# Altium schematic symbol library relay.SCHLIB: 425 symbols (part 2 of 3)
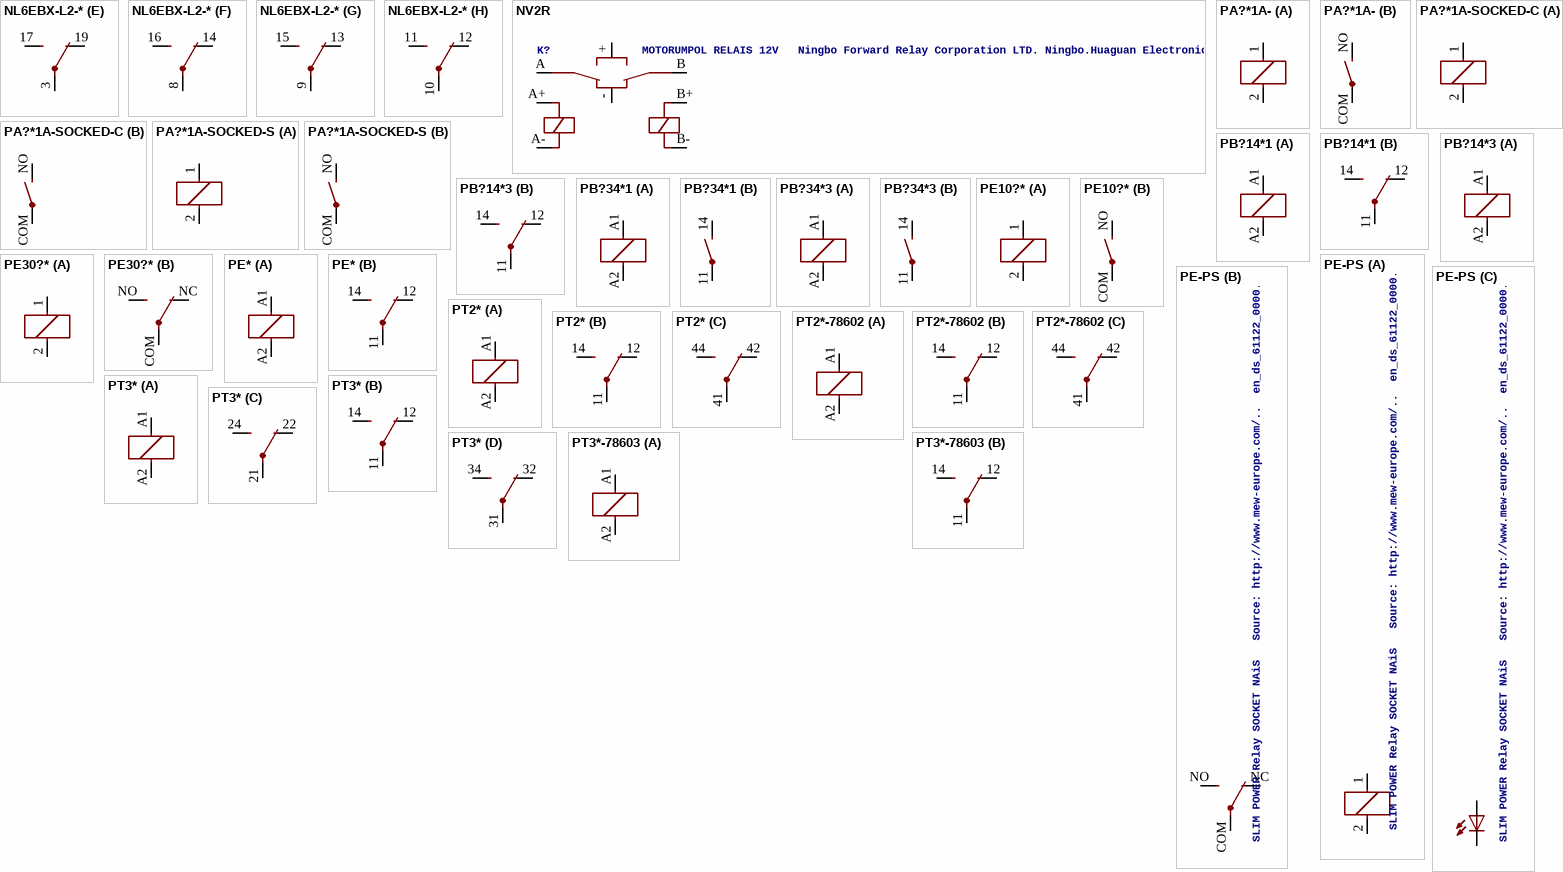
[diagram p31: symbols NL6EBX-L2-* to PT3*-78603]

## PE10?*
designator K?, comment SLIM POWER Relay NAiS   Source: http://www.mew-europe.com/..  en_ds_61122_0000.pdf  (value not drawn)
MPN: APE10006; MPN: APE10012; MPN: APE10018; MPN: APE10024; MPN: APE10048; MPN: APE1004H; MPN: APE10060; MPN: APE10106; MPN: APE10112; MPN: APE10118; MPN: APE10124; MPN: APE10148; MPN: APE1014H; MPN: APE10160; OC_FARNELL: unknown; OC_NEWARK: unknown; OC_NEWARK: 11N2525; OC_NEWARK: 11N2526; OC_NEWARK: 11N2527; OC_NEWARK: 11N2528; OC_NEWARK: 27M3556; OC_NEWARK: 11N2529; OC_NEWARK: 11N2530; OC_NEWARK: 11N2531; OC_NEWARK: 11N2532; OC_NEWARK: 11N2533; OC_NEWARK: 11N2534; OC_NEWARK: 11N2536; OC_NEWARK: 11N2535; OC_NEWARK: 11N2537
footprint PE-FORM-A
part A pins: 1, 2
part B pins: COM P, NO S

## PE30?*
designator K?, comment SLIM POWER Relay NAiS   Source: http://www.mew-europe.com/..  en_ds_61122_0000.pdf  (value not drawn)
MPN: APE30006; MPN: APE30012; MPN: APE30018; MPN: APE30024; MPN: APE30048; MPN: APE3004H; MPN: APE30060; MPN: APE30112; MPN: APE30118; MPN: APE30124; MPN: APE30148; MPN: APE3014H; MPN: APE30160; MF: AROMAT/ MATSUSHITA; OC_FARNELL: unknown; OC_NEWARK: unknown; OC_NEWARK: 11N2538; OC_NEWARK: 37J1097; OC_NEWARK: 11N2539; OC_FARNELL: 1703738; OC_NEWARK: 01H7899; OC_NEWARK: 11N2540; OC_NEWARK: 55M0343; OC_NEWARK: 13J1294; OC_NEWARK: 13P0932; OC_NEWARK: 11N2542; OC_NEWARK: 13P0933; OC_NEWARK: 11N2543; OC_NEWARK: 36K1690; OC_NEWARK: 11N2544
footprint PE-FORM-C
part A pins: 1, 2
part B pins: COM P, NC O, NO S

## PE*
designator K?, comment Miniature PCB Relay 1 pole 5 A SCHRACK   Source: http://www.schrack.com/.. 5807.pdf Miniature PCB Relay bistable 1pole 5 A, polarized bistable version Source: http://www.schrack.com/.. 5808.pdf  (value not drawn)
OC_FARNELL: unknown; OC_NEWARK: unknown
footprint PE
part A pins: A1 1, A2 2
part B pins: 11 P, 12 O, 14 S

## PE-PS
designator K?, comment SLIM POWER Relay SOCKET NAiS   Source: http://www.mew-europe.com/..  en_ds_61122_0000.pdf
OC_FARNELL: unknown; OC_NEWARK: unknown
footprint PE-SOCKET
part A pins: 1, 2
part B pins: COM P, NC O, NO S
part C pins: +LED A, -LED C

## PT2*
designator K?, comment Miniature Relay SCHRACK   2 pole 12 A DC- or AC-coil Source: http://www.schrack.com/.. 5823.pdf Socked 78602 Source: http://www.schrack.com/.. 5836.pdf  (value not drawn)
MPN: PT271615; MF: TYCO ELECTRONICS; OC_FARNELL: unknown; OC_NEWARK: unknown; OC_NEWARK: 96H9720
footprint PT-2
part A pins: A1 1, A2 2
part B pins: 11 P, 12 O, 14 S
part C pins: 41 P, 42 O, 44 S

## PT2*-78602
designator K?, comment Miniature Relay SCHRACK   2 pole 12 A DC- or AC-coil Source: http://www.schrack.com/.. 5823.pdf Socked 78602 Source: http://www.schrack.com/.. 5836.pdf  (value not drawn)
OC_FARNELL: unknown; OC_NEWARK: unknown
footprint PT78602
part A pins: A1 1, A2 2
part B pins: 11 P, 12 O, 14 S
part C pins: 41 P, 42 O, 44 S

## PT3*
designator K?, comment Miniature Relay SCHRACK   3 pole 10 A DC- or AC-coil Source: http://www.schrack.com/.. 5823.pdf Socked 78603 Source: http://www.schrack.com/.. 5836.pdf  (value not drawn)
OC_FARNELL: unknown; OC_NEWARK: unknown
footprint PT-3
part A pins: A1 1, A2 2
part B pins: 11 P, 12 O, 14 S
part C pins: 21 P, 22 O, 24 S
part D pins: 31 P, 32 O, 34 S

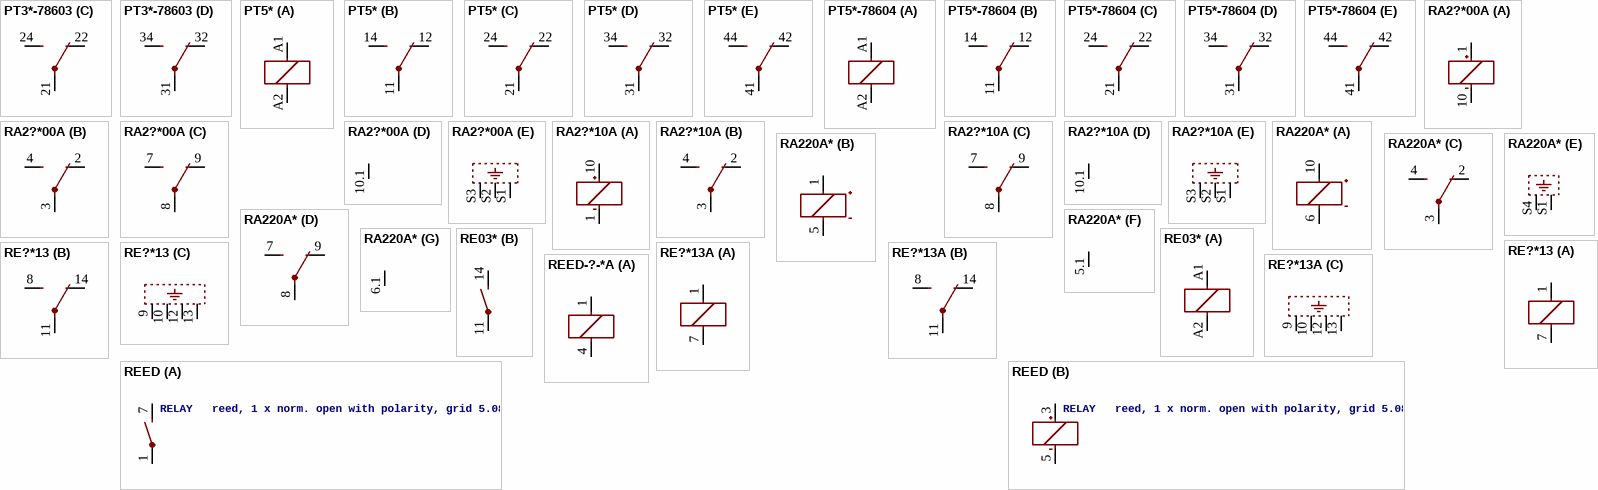
[diagram p14: symbols PT3*-78603 to REED-?-*A]

## PT3*-78603
designator K?, comment Miniature Relay SCHRACK   3 pole 10 A DC- or AC-coil Source: http://www.schrack.com/.. 5823.pdf Socked 78603 Source: http://www.schrack.com/.. 5836.pdf  (value not drawn)
OC_FARNELL: unknown; OC_NEWARK: unknown
footprint PT78603
part A pins: A1 1, A2 2
part B pins: 11 P, 12 O, 14 S
part C pins: 21 P, 22 O, 24 S
part D pins: 31 P, 32 O, 34 S

## PT5*
designator K?, comment Miniature Relay SCHRACK   2 pole 12 A, 3 pole 10 A or 4 pole 6 A DC- or AC-coil Source: http://www.schrack.com/.. 5823.pdf Socked 78604 Source: http://www.schrack.com/.. 5836.pdf  (value not drawn)
MPN: PT571524; MPN: PT571615; MPN: PT571730; MF: FARNELL; OC_FARNELL: unknown; OC_NEWARK: unknown; OC_FARNELL: 3072836; OC_NEWARK: 08J0830; OC_FARNELL: 3072990; OC_NEWARK: 85H0667; OC_FARNELL: 3073014; OC_NEWARK: 18J8266
footprint PT-4
part A pins: A1 1, A2 2
part B pins: 11 P, 12 O, 14 S
part C pins: 21 P, 22 O, 24 S
part D pins: 31 P, 32 O, 34 S
part E pins: 41 P, 42 O, 44 S

## PT5*-78604
designator K?, comment Miniature Relay SCHRACK   2 pole 12 A, 3 pole 10 A or 4 pole 6 A DC- or AC-coil Source: http://www.schrack.com/.. 5823.pdf Socked 78604 Source: http://www.schrack.com/.. 5836.pdf  (value not drawn)
OC_FARNELL: unknown; OC_NEWARK: unknown
footprint PT78604
part A pins: A1 1, A2 2
part B pins: 11 P, 12 O, 14 S
part C pins: 21 P, 22 O, 24 S
part D pins: 31 P, 32 O, 34 S
part E pins: 41 P, 42 O, 44 S

## RA2?*00A
designator K?, comment MICROWAVE RELAY FOR ATTENUATOR CIRCUIT NAiS   Source: http://www.mew-europe.com/.. en_ds_61308_0000.pdf  (value not drawn)
MPN: ARA200A03; OC_FARNELL: unknown; OC_NEWARK: 13P1235; OC_NEWARK: unknown
footprint RA
part A pins: 1 +, 10 -
part B pins: 2 O, 3 P, 4 S
part C pins: 7 S, 8 P, 9 O
part D pins: 10.1 -
part E pins: S1 SH@3, S2 SH@2, S3 SH@1

## RA2?*10A
designator K?, comment MICROWAVE RELAY FOR ATTENUATOR CIRCUIT NAiS   Source: http://www.mew-europe.com/.. en_ds_61308_0000.pdf  (value not drawn)
MPN: ARA210A05; MPN: ARA210A06; MPN: ARA210A12; MPN: ARA210A4H; MF: AROMAT/ MATSUSHITA; OC_FARNELL: unknown; OC_NEWARK: unknown; OC_NEWARK: 10C4091; OC_NEWARK: 10C4092; OC_NEWARK: 64K3073; OC_NEWARK: 64K3074
footprint RA-1COIL
part A pins: 1 -, 10 +
part B pins: 2 O, 3 P, 4 S
part C pins: 7 S, 8 P, 9 O
part D pins: 10.1 -
part E pins: S1 SH@3, S2 SH@2, S3 SH@1

## RA220A*
designator K?, comment MICROWAVE RELAY FOR ATTENUATOR CIRCUIT NAiS   Source: http://www.mew-europe.com/.. en_ds_61308_0000.pdf  (value not drawn)
MPN: ARA220A03Z; MPN: ARA220A05; MPN: ARA220A12Z; MPN: ARA220A4HZ; OC_FARNELL: unknown; OC_NEWARK: 12N3559; OC_NEWARK: 15P8679; OC_NEWARK: unknown; OC_NEWARK: 12N3560; OC_NEWARK: 12N3561
footprint RA-2COIL
part A pins: 6 -, 10 +
part B pins: 1 +, 5 -
part C pins: 2 O, 3 P, 4 S
part D pins: 7 S, 8 P, 9 O
part E pins: S1 SH@2, S4 SH@1
part F pins: 5.1 -
part G pins: 6.1 -

## RE03*
designator K?, comment Miniature PCB Relay 1 pole 6 A SCHRACK   Source: http://www.schrack.com/.. 5812.pdf  (value not drawn)
MPN: RE030005; MPN: RE030006; MPN: RE030012; MPN: RE030024; MPN: RE032005; MPN: RE032012; MPN: RE032024; MF: TYCO ELECTRONICS; OC_FARNELL: 515838; OC_NEWARK: 52F908; OC_FARNELL: unknown; OC_NEWARK: 92C1858; OC_FARNELL: 515840; OC_NEWARK: 17M1743; OC_FARNELL: 515851; OC_NEWARK: 52F910; OC_FARNELL: 1629023; OC_NEWARK: unknown; OC_NEWARK: 97K8812; OC_FARNELL: 9659684; OC_NEWARK: 97K8813; OC_FARNELL: 9659692; OC_NEWARK: 97K8814
footprint RE-SCHRACK
part A pins: A1 1, A2 2
part B pins: 11 P, 14 S

## RE?*13
designator K?, comment SMALL MICROWAVE RELAYS FOR BROADCASTING INDUSTRY NAiS   Source: http://www.mew-europe.com/.. en_ds_61310_0000.pdf  (value not drawn)
MPN: ARE1303; MPN: ARE1306; MPN: ARE1309; MPN: ARE1312; MPN: ARE1324; MPN: ARE134H; MF: AROMAT/ MATSUSHITA; OC_FARNELL: 1448347; OC_NEWARK: 64K3078; OC_FARNELL: unknown; OC_NEWARK: 11N2917; OC_NEWARK: 95M8248; OC_FARNELL: 3773000; OC_NEWARK: 13P1245; OC_NEWARK: 11N2919; OC_FARNELL: 3772998; OC_NEWARK: 13P1246
footprint RE
part A pins: 1, 7 2
part B pins: 8 S, 11 P, 14 O
part C pins: 9 SH@1, 10 SH@2, 12 SH@3, 13 SH@4

## RE?*13A
designator K?, comment SMALL MICROWAVE RELAYS FOR BROADCASTING INDUSTRY NAiS   Source: http://www.mew-europe.com/.. en_ds_61310_0000.pdf  (value not drawn)
MPN: ARE13A03; MPN: ARE13A06; MPN: ARE13A09; MPN: ARE13A12; MPN: ARE13A24; MPN: ARE13A4H; OC_FARNELL: unknown; OC_NEWARK: 71M0380; OC_NEWARK: 11N2902; OC_NEWARK: 11N2904; OC_FARNELL: 3773036; OC_NEWARK: 13P1241; OC_NEWARK: 11N2909; OC_FARNELL: 3773024; OC_NEWARK: 11N2913
footprint RE-SMD
part A pins: 1, 7 2
part B pins: 8 S, 11 P, 14 O
part C pins: 9 SH@1, 10 SH@2, 12 SH@3, 13 SH@4

## REED
designator K?, comment RELAY   reed, 1 x norm. open with polarity, grid 5.08
OC_FARNELL: unknown; OC_NEWARK: unknown
footprint REED
part A pins: 1 P, 7 S
part B pins: 3 +, 5 -

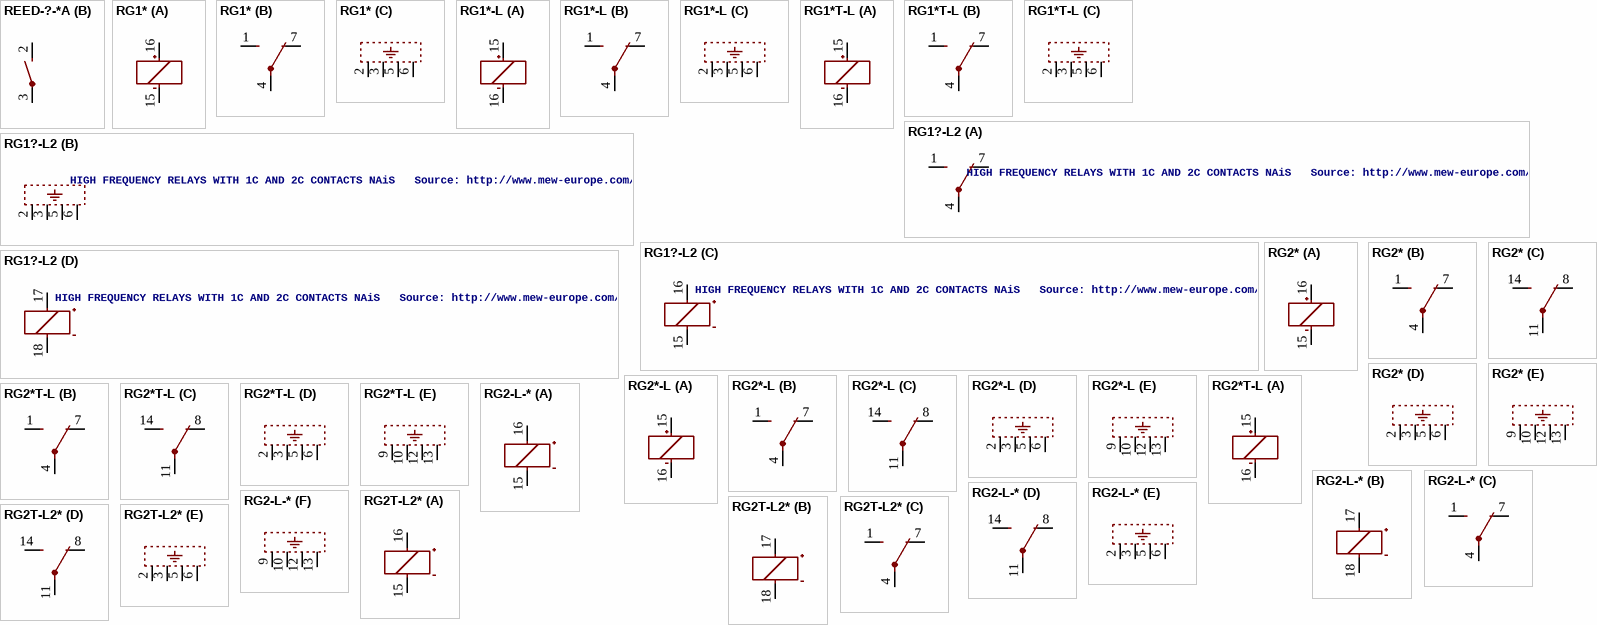
[diagram p15: symbols REED-?-*A to RG2T-L2*]

## REED-?-*A
designator K?, comment Single in line reed relay series A NAiS   Source: http://www.mew-europe.com/..  en_ds_61001_0000.pdf  (value not drawn)
OC_FARNELL: unknown; OC_NEWARK: unknown
footprint REED-SERIES-A
part A pins: 1, 4 2
part B pins: 2 S, 3 P

## RG1*
designator K?, comment HIGH FREQUENCY RELAYS WITH 1C AND 2C CONTACTS NAiS   Source: http://www.mew-europe.com/.. en_ds_61302_0000.pdf  (value not drawn)
OC_FARNELL: unknown; OC_NEWARK: unknown
footprint RG1
part A pins: 15 -, 16 +
part B pins: 1 S, 4 P, 7 O
part C pins: 2 SH@1, 3 SH@2, 5 SH@3, 6 SH@4

## RG1*-L
designator K?, comment HIGH FREQUENCY RELAYS WITH 1C AND 2C CONTACTS NAiS   Source: http://www.mew-europe.com/.. en_ds_61302_0000.pdf  (value not drawn)
OC_FARNELL: unknown; OC_NEWARK: unknown
footprint RG1
part A pins: 15 +, 16 -
part B pins: 1 S, 4 P, 7 O
part C pins: 2 SH@1, 3 SH@2, 5 SH@3, 6 SH@4

## RG1*T-L
designator K?, comment HIGH FREQUENCY RELAYS WITH 1C AND 2C CONTACTS NAiS   Source: http://www.mew-europe.com/.. en_ds_61302_0000.pdf  (value not drawn)
OC_FARNELL: unknown; OC_NEWARK: unknown
footprint RG1
part A pins: 15 +, 16 -
part B pins: 1 S, 4 P, 7 O
part C pins: 2 SH@1, 3 SH@2, 5 SH@3, 6 SH@4

## RG1?-L2
designator K?, comment HIGH FREQUENCY RELAYS WITH 1C AND 2C CONTACTS NAiS   Source: http://www.mew-europe.com/.. en_ds_61302_0000.pdf
OC_FARNELL: unknown; OC_NEWARK: unknown
footprint RG1
part A pins: 1 S, 4 P, 7 O
part B pins: 2 SH@1, 3 SH@2, 5 SH@3, 6 SH@4
part C pins: 15 -, 16 +
part D pins: 17 +, 18 -

## RG2*
designator K?, comment HIGH FREQUENCY RELAYS WITH 1C AND 2C CONTACTS NAiS   Source: http://www.mew-europe.com/.. en_ds_61302_0000.pdf  (value not drawn)
OC_FARNELL: unknown; OC_NEWARK: unknown
footprint RG2
part A pins: 15 -, 16 +
part B pins: 1 S, 4 P, 7 O
part C pins: 8 O, 11 P, 14 S
part D pins: 2 SH@1, 3 SH@2, 5 SH@3, 6 SH@4
part E pins: 9 SH@1, 10 SH@2, 12 SH@3, 13 SH@4

## RG2*-L
designator K?, comment HIGH FREQUENCY RELAYS WITH 1C AND 2C CONTACTS NAiS   Source: http://www.mew-europe.com/.. en_ds_61302_0000.pdf  (value not drawn)
OC_FARNELL: unknown; OC_NEWARK: unknown
footprint RG2
part A pins: 15 +, 16 -
part B pins: 1 S, 4 P, 7 O
part C pins: 8 O, 11 P, 14 S
part D pins: 2 SH@1, 3 SH@2, 5 SH@3, 6 SH@4
part E pins: 9 SH@1, 10 SH@2, 12 SH@3, 13 SH@4

## RG2*T-L
designator K?, comment HIGH FREQUENCY RELAYS WITH 1C AND 2C CONTACTS NAiS   Source: http://www.mew-europe.com/.. en_ds_61302_0000.pdf  (value not drawn)
OC_FARNELL: unknown; OC_NEWARK: unknown
footprint RG2
part A pins: 15 +, 16 -
part B pins: 1 S, 4 P, 7 O
part C pins: 8 O, 11 P, 14 S
part D pins: 2 SH@1, 3 SH@2, 5 SH@3, 6 SH@4
part E pins: 9 SH@1, 10 SH@2, 12 SH@3, 13 SH@4

## RG2-L-*
designator K?, comment HIGH FREQUENCY RELAYS WITH 1C AND 2C CONTACTS NAiS   Source: http://www.mew-europe.com/.. en_ds_61302_0000.pdf  (value not drawn)
OC_FARNELL: unknown; OC_NEWARK: unknown
footprint RG2
part A pins: 15 -, 16 +
part B pins: 17 +, 18 -
part C pins: 1 S, 4 P, 7 O
part D pins: 8 O, 11 P, 14 S
part E pins: 2 SH@1, 3 SH@2, 5 SH@3, 6 SH@4
part F pins: 9 SH@1, 10 SH@2, 12 SH@3, 13 SH@4

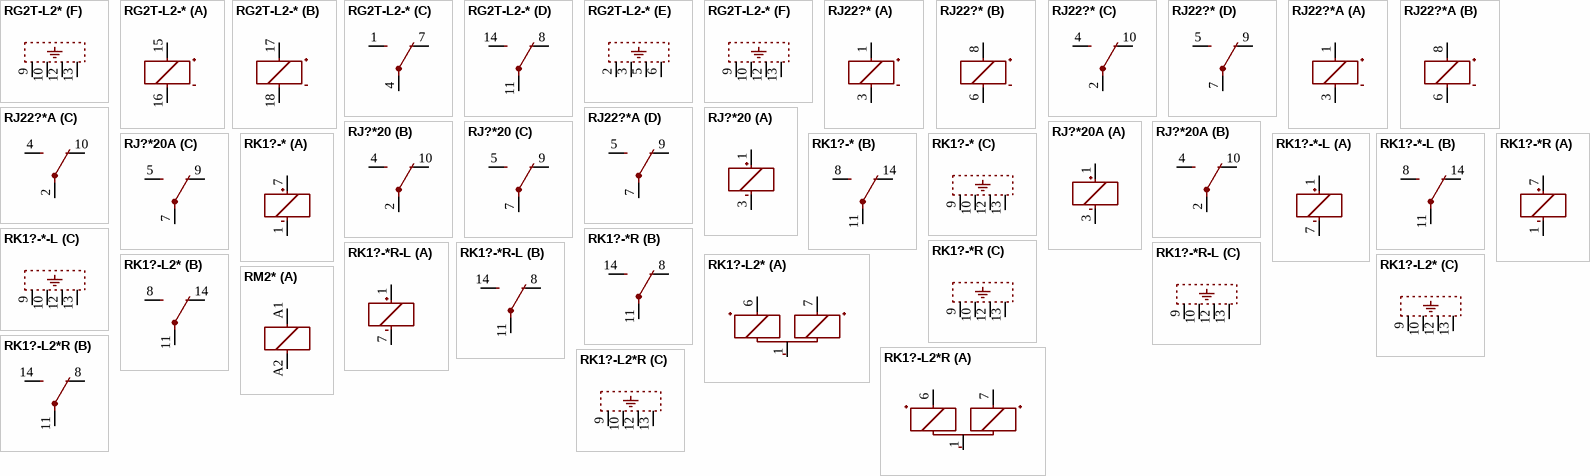
[diagram p16: symbols RG2T-L2* to RM2*]

## RG2T-L2*
designator K?, comment HIGH FREQUENCY RELAYS WITH 1C AND 2C CONTACTS NAiS   Source: http://www.mew-europe.com/.. en_ds_61302_0000.pdf  (value not drawn)
OC_FARNELL: unknown; OC_NEWARK: unknown
footprint RG2
part A pins: 15 -, 16 +
part B pins: 17 +, 18 -
part C pins: 1 S, 4 P, 7 O
part D pins: 8 O, 11 P, 14 S
part E pins: 2 SH@1, 3 SH@2, 5 SH@3, 6 SH@4
part F pins: 9 SH@1, 10 SH@2, 12 SH@3, 13 SH@4

## RG2T-L2-*
designator K?, comment HIGH FREQUENCY RELAYS WITH 1C AND 2C CONTACTS NAiS   Source: http://www.mew-europe.com/.. en_ds_61302_0000.pdf  (value not drawn)
OC_FARNELL: unknown; OC_NEWARK: unknown
footprint RG2
part A pins: 15 +, 16 -
part B pins: 17 +, 18 -
part C pins: 1 S, 4 P, 7 O
part D pins: 8 O, 11 P, 14 S
part E pins: 2 SH@1, 3 SH@2, 5 SH@3, 6 SH@4
part F pins: 9 SH@1, 10 SH@2, 12 SH@3, 13 SH@4

## RJ22?*
designator K?, comment SMD RELAYS WITH 5GHz CAPABILITIES NAiS   Source: http://www.mew-europe.com/.. en_ds_61313_0000.pdf  (value not drawn)
MPN: ARJ2203; MPN: ARJ2212; MPN: ARJ2224; MPN: ARJ224H; OC_FARNELL: unknown; OC_NEWARK: 11N2935; OC_NEWARK: 11N2936; OC_NEWARK: 11N2937; OC_NEWARK: 11N2938
footprint RJ
part A pins: 1 +, 3 -
part B pins: 6 -, 8 +
part C pins: 2 P, 4 S, 10 O
part D pins: 5 S, 7 P, 9 O

## RJ22?*A
designator K?, comment SMD RELAYS WITH 5GHz CAPABILITIES NAiS   Source: http://www.mew-europe.com/.. en_ds_61313_0000.pdf  (value not drawn)
MPN: ARJ22A03; MPN: ARJ22A12; MPN: ARJ22A24; MPN: ARJ22A4H; OC_FARNELL: unknown; OC_NEWARK: 11N2929; OC_FARNELL: 9008446; OC_NEWARK: 13P1249; OC_NEWARK: 11N2932; OC_NEWARK: 13P1250
footprint RJ-SMD
part A pins: 1 +, 3 -
part B pins: 6 -, 8 +
part C pins: 2 P, 4 S, 10 O
part D pins: 5 S, 7 P, 9 O

## RJ?*20
designator K?, comment SMD RELAYS WITH 5GHz CAPABILITIES NAiS   Source: http://www.mew-europe.com/.. en_ds_61313_0000.pdf  (value not drawn)
MPN: ARJ2003; MPN: ARJ2012; MPN: ARJ2024; MPN: ARJ204H; MF: AROMAT/ MATSUSHITA; OC_FARNELL: unknown; OC_NEWARK: 11N2927; OC_NEWARK: 81C8602; OC_NEWARK: 11N2928; OC_NEWARK: 63H2424
footprint RJ
part A pins: 1 +, 3 -
part B pins: 2 P, 4 S, 10 O
part C pins: 5 S, 7 P, 9 O

## RJ?*20A
designator K?, comment SMD RELAYS WITH 5GHz CAPABILITIES NAiS   Source: http://www.mew-europe.com/.. en_ds_61313_0000.pdf  (value not drawn)
MPN: ARJ20A03; MPN: ARJ20A12; MPN: ARJ20A24; MPN: ARJ20A4H; OC_FARNELL: unknown; OC_NEWARK: 11N2921; OC_FARNELL: 8928207; OC_NEWARK: 13P1247; OC_NEWARK: 11N2924; OC_NEWARK: 13P1248
footprint RJ-SMD
part A pins: 1 +, 3 -
part B pins: 2 P, 4 S, 10 O
part C pins: 5 S, 7 P, 9 O

## RK1?-*
designator K?, comment 1.5 GHz MICROWAVE RELAY NAiS   Source: http://www.mew-europe.com/.. en_ds_61311_0000.pdf  (value not drawn)
MPN: RK1-12V; MPN: RK1-24V; MPN: RK1-4.5V; MPN: RK1-5V; MPN: RK1-6V; MF: AROMAT/ MATSUSHITA; OC_FARNELL: unknown; OC_NEWARK: 13P6876; OC_NEWARK: 13P6877; OC_NEWARK: unknown; OC_NEWARK: 13P6878; OC_NEWARK: 13P6879; OC_NEWARK: 10C9196
footprint RK1A
part A pins: 1 -, 7 +
part B pins: 8 S, 11 P, 14 O
part C pins: 9 SH@1, 10 SH@2, 12 SH@3, 13 SH@4

## RK1?-*-L
designator K?, comment 1.5 GHz MICROWAVE RELAY NAiS   Source: http://www.mew-europe.com/.. en_ds_61311_0000.pdf  (value not drawn)
MPN: RK1-L-4.5V; MPN: RK1-L-5V; MF: AROMAT/ MATSUSHITA; OC_FARNELL: unknown; OC_NEWARK: unknown; OC_NEWARK: 11N5893; OC_NEWARK: 10C9186
footprint RK1A
part A pins: 1 +, 7 -
part B pins: 8 S, 11 P, 14 O
part C pins: 9 SH@1, 10 SH@2, 12 SH@3, 13 SH@4

## RK1?-*R
designator K?, comment 1.5 GHz MICROWAVE RELAY NAiS   Source: http://www.mew-europe.com/.. en_ds_61311_0000.pdf  (value not drawn)
OC_FARNELL: unknown; OC_NEWARK: unknown
footprint RK1A
part A pins: 1 -, 7 +
part B pins: 8 O, 11 P, 14 S
part C pins: 9 SH@1, 10 SH@2, 12 SH@3, 13 SH@4

## RK1?-*R-L
designator K?, comment 1.5 GHz MICROWAVE RELAY NAiS   Source: http://www.mew-europe.com/.. en_ds_61311_0000.pdf  (value not drawn)
OC_FARNELL: unknown; OC_NEWARK: unknown
footprint RK1A
part A pins: 1 +, 7 -
part B pins: 8 O, 11 P, 14 S
part C pins: 9 SH@1, 10 SH@2, 12 SH@3, 13 SH@4

## RK1?-L2*
designator K?, comment 1.5 GHz MICROWAVE RELAY NAiS   Source: http://www.mew-europe.com/.. en_ds_61311_0000.pdf  (value not drawn)
MPN: RK1-L2-12V; MF: AROMAT/ MATSUSHITA; OC_FARNELL: 1616207; OC_NEWARK: 10C9189
footprint RKL2
part A pins: 1 -, 6 S+, 7 R+
part B pins: 8 S, 11 P, 14 O
part C pins: 9 SH@1, 10 SH@2, 12 SH@3, 13 SH@4

## RK1?-L2*R
designator K?, comment 1.5 GHz MICROWAVE RELAY NAiS   Source: http://www.mew-europe.com/.. en_ds_61311_0000.pdf  (value not drawn)
OC_FARNELL: unknown; OC_NEWARK: unknown
footprint RKL2
part A pins: 1 -, 6 S+, 7 R+
part B pins: 8 O, 11 P, 14 S
part C pins: 9 SH@1, 10 SH@2, 12 SH@3, 13 SH@4

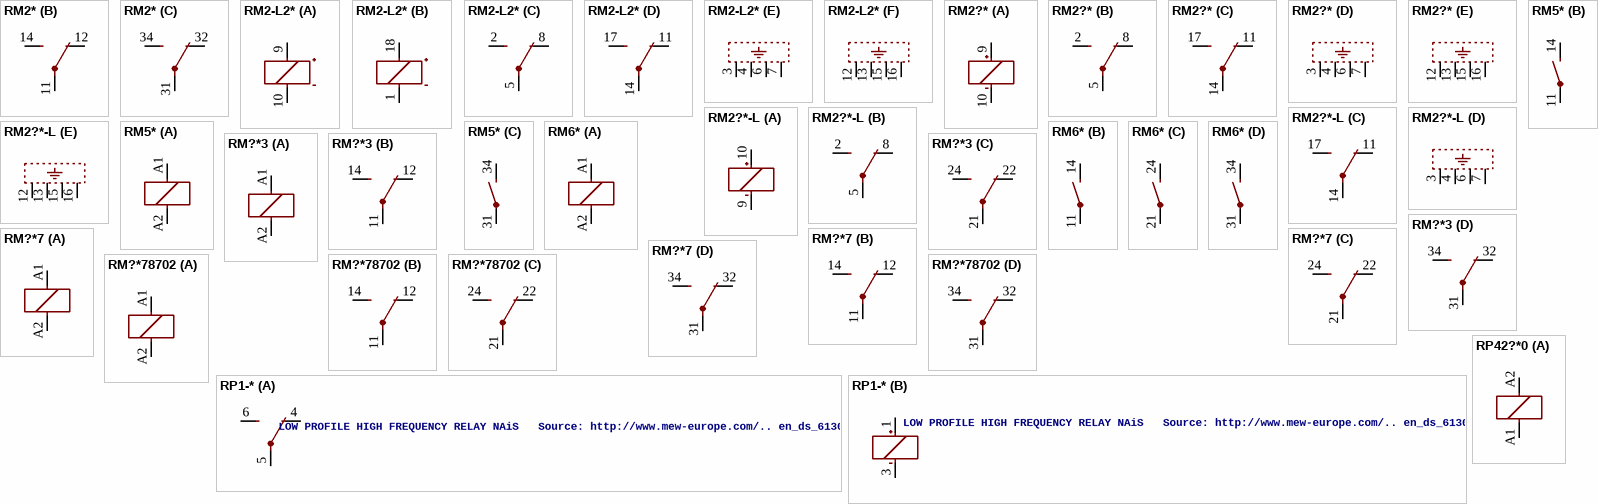
[diagram p17: symbols RM2* to RP42?*0]

## RM2*
designator K?, comment Power Relay SCHRACK   2 pole 16 A, DC- or AC-coil Source: http://www.schrack.com/.. 5829.pdf  (value not drawn)
OC_FARNELL: unknown; OC_NEWARK: unknown
footprint RM-2
part A pins: A1 1, A2 2
part B pins: 11 P, 12 O, 14 S
part C pins: 31 P, 32 O, 34 S

## RM2-L2*
designator K?, comment 4 GHz 2 FORM C MICROWAVE RELAY NAiS   Source: http://www.mew-europe.com/.. en_ds_61305_0000.pdf  (value not drawn)
OC_FARNELL: unknown; OC_NEWARK: unknown
footprint RM2
part A pins: 9 +, 10 -
part B pins: 1 -, 18 +
part C pins: 2 S, 5 P, 8 O
part D pins: 11 O, 14 P, 17 S
part E pins: 3 SH@1, 4 SH@2, 6 SH@3, 7 SH@4
part F pins: 12 SH@1, 13 SH@2, 15 SH@3, 16 SH@4

## RM2?*
designator K?, comment 4 GHz 2 FORM C MICROWAVE RELAY NAiS   Source: http://www.mew-europe.com/.. en_ds_61305_0000.pdf  (value not drawn)
OC_FARNELL: unknown; OC_NEWARK: unknown
footprint RM
part A pins: 9 +, 10 -
part B pins: 2 S, 5 P, 8 O
part C pins: 11 O, 14 P, 17 S
part D pins: 3 SH@1, 4 SH@2, 6 SH@3, 7 SH@4
part E pins: 12 SH@1, 13 SH@2, 15 SH@3, 16 SH@4

## RM2?*-L
designator K?, comment 4 GHz 2 FORM C MICROWAVE RELAY NAiS   Source: http://www.mew-europe.com/.. en_ds_61305_0000.pdf  (value not drawn)
OC_FARNELL: unknown; OC_NEWARK: unknown
footprint RM
part A pins: 9 -, 10 +
part B pins: 2 S, 5 P, 8 O
part C pins: 11 O, 14 P, 17 S
part D pins: 3 SH@1, 4 SH@2, 6 SH@3, 7 SH@4
part E pins: 12 SH@1, 13 SH@2, 15 SH@3, 16 SH@4

## RM5*
designator K?, comment Power Relay SCHRACK   2 pole 16 A, DC- or AC-coil Source: http://www.schrack.com/.. 5832.pdf  (value not drawn)
OC_FARNELL: unknown; OC_NEWARK: unknown
footprint RM-6
part A pins: A1 1, A2 2
part B pins: 11 P, 14 S
part C pins: 31 P, 34 S

## RM6*
designator K?, comment Power Relay SCHRACK   3 pole 10 A, DC- or AC-coil Source: http://www.schrack.com/.. 5832.pdf  (value not drawn)
MPN: RM607524; MPN: RM607730; OC_FARNELL: unknown; OC_NEWARK: unknown; OC_NEWARK: 48M7685; OC_NEWARK: 03M2867
footprint RM-5
part A pins: A1 1, A2 2
part B pins: 11 P, 14 S
part C pins: 21 P, 24 S
part D pins: 31 P, 34 S

## RM?*3
designator K?, comment Power Relay SCHRACK   3 pole 10 A, DC- or AC-coil Source: http://www.schrack.com/.. 5829.pdf Socket with PCB terminals Source: http://www.schrack.com/.. 5841.pdf  (value not drawn)
OC_FARNELL: unknown; OC_NEWARK: unknown
footprint RM-2/3/7
part A pins: A1 1, A2 2
part B pins: 11 P, 12 O, 14 S
part C pins: 21 P, 22 O, 24 S
part D pins: 31 P, 32 O, 34 S

## RM?*7
designator K?, comment Power Relay SCHRACK   3 pole 10 A, DC- or AC-coil Source: http://www.schrack.com/.. 5829.pdf Socket with PCB terminals Source: http://www.schrack.com/.. 5841.pdf  (value not drawn)
OC_FARNELL: unknown; OC_NEWARK: unknown
footprint RM-2/3/7
part A pins: A1 1, A2 2
part B pins: 11 P, 12 O, 14 S
part C pins: 21 P, 22 O, 24 S
part D pins: 31 P, 32 O, 34 S

## RM?*78702
designator K?, comment Power Relay SCHRACK   3 pole 10 A, DC- or AC-coil Source: http://www.schrack.com/.. 5829.pdf Socket with PCB terminals Source: http://www.schrack.com/.. 5841.pdf  (value not drawn)
MPN: RM78702; MF: TYCO ELECTRONICS; OC_FARNELL: 1652632; OC_NEWARK: 36K3468
footprint RM78702
part A pins: A1 1, A2 2
part B pins: 11 P, 12 O, 14 S
part C pins: 21 P, 22 O, 24 S
part D pins: 31 P, 32 O, 34 S

## RP1-*
designator K?, comment LOW PROFILE HIGH FREQUENCY RELAY NAiS   Source: http://www.mew-europe.com/.. en_ds_61306_0000.pdf
MPN: RP1-12V; MPN: RP1-24V; MPN: RP1-5V; MF: AROMAT/ MATSUSHITA; OC_FARNELL: unknown; OC_NEWARK: unknown; OC_NEWARK: 92B3783; OC_NEWARK: 10C9248; OC_NEWARK: 64K3170
footprint RP
part A pins: 4 O, 5 P, 6 S
part B pins: 1 +, 3 -

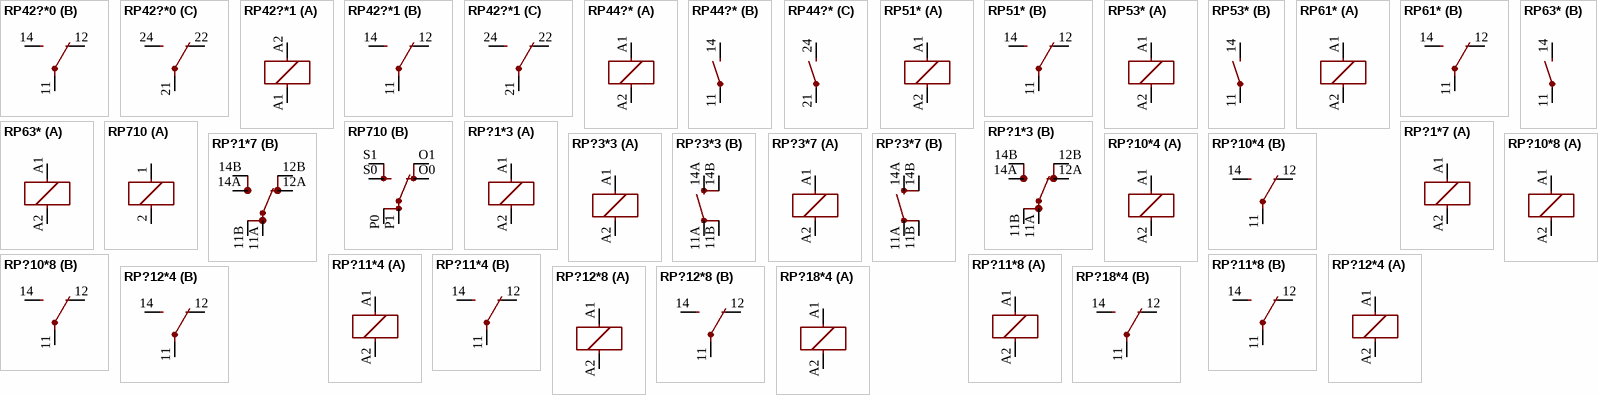
[diagram p18: symbols RP42?*0 to RP?18*4]

## RP42?*0
designator K?, comment Power PCB Relay RP II/2 Schrack   2 pole 8 A Source: http://www.schrack.com/.. 5844.pdf  (value not drawn)
MPN: RP420005; MPN: RP420006; MPN: RP420012; MPN: RP420024; MPN: RP420048; MPN: RP420060; MPN: RP420110; MF: TYCO ELECTRONICS; OC_FARNELL: unknown; OC_NEWARK: 48M7798; OC_NEWARK: 48M7799; OC_FARNELL: 3103330; OC_NEWARK: 90B4410; OC_FARNELL: 1703720; OC_NEWARK: 51B969; OC_NEWARK: 92C3381; OC_NEWARK: 48M7803; OC_NEWARK: 08H3601
footprint RP420
part A pins: A1 2, A2 1
part B pins: 11 P, 12 O, 14 S
part C pins: 21 P, 22 O, 24 S

## RP42?*1
designator K?, comment Power PCB Relay RP II/2 Schrack   2 pole 8 A Source: http://www.schrack.com/.. 5844.pdf  (value not drawn)
MPN: 6-1393234-4; MPN: 6-1393234-5; MPN: RP421012; MPN: RP421024; MPN: RP421048; MPN: RP421060; MPN: RP421110; MF: TYCO ELECTRONICS; OC_FARNELL: unknown; OC_NEWARK: 16H0760; OC_NEWARK: 16H0761; OC_NEWARK: 90B5481; OC_FARNELL: 1608388; OC_NEWARK: 01C0518; OC_NEWARK: 08H3604; OC_NEWARK: 84H0645; OC_NEWARK: 39C2625
footprint RP420
part A pins: A1 2, A2 1
part B pins: 11 P, 12 O, 14 S
part C pins: 21 P, 22 O, 24 S

## RP44?*
designator K?, comment Power PCB Relay RP II/2 Schrack   2 pole 8 A Source: http://www.schrack.com/.. 5844.pdf  (value not drawn)
MPN: RP440012; MPN: RP440024; MPN: RP441012; MPN: RP441024; MF: TYCO ELECTRONICS; OC_FARNELL: unknown; OC_NEWARK: unknown; OC_NEWARK: 07H9451; OC_NEWARK: 48M7816; OC_NEWARK: 09H1465; OC_NEWARK: 48M7817
footprint RP440
part A pins: A1 1, A2 2
part B pins: 11 P, 14 S
part C pins: 21 P, 24 S

## RP51*
designator K?, comment Power PCB Relay RP I SCHRACK   1 pole 8 A Vertical version Source: http://www.schrack.com/.. 5845.pdf  (value not drawn)
OC_FARNELL: unknown; OC_NEWARK: unknown
footprint RP51
part A pins: A1 1, A2 2
part B pins: 11 P, 12 O, 14 S

## RP53*
designator K?, comment Power PCB Relay RP I SCHRACK   1 pole 8 A Vertical version Source: http://www.schrack.com/.. 5845.pdf  (value not drawn)
MPN: RP530060-3-0; OC_FARNELL: unknown; OC_NEWARK: unknown; OC_NEWARK: 16C5685
footprint RP53
part A pins: A1 1, A2 2
part B pins: 11 P, 14 S

## RP61*
designator K?, comment Power PCB Relay RP I SCHRACK   1 pole 8 A Horizontal version Source: http://www.schrack.com/.. 5845.pdf  (value not drawn)
OC_FARNELL: unknown; OC_NEWARK: unknown
footprint RP61
part A pins: A1 1, A2 2
part B pins: 11 P, 12 O, 14 S

## RP63*
designator K?, comment Power PCB Relay RP I SCHRACK   1 pole 8 A Horizontal version Source: http://www.schrack.com/.. 5845.pdf  (value not drawn)
OC_FARNELL: unknown; OC_NEWARK: unknown
footprint RP63
part A pins: A1 1, A2 2
part B pins: 11 P, 14 S

## RP710
designator K?, comment RELAY   2 x switch, Schrack  (value not drawn)
MPN: RP710024; MF: TYCO ELECTRONICS; OC_FARNELL: 388312; OC_NEWARK: 17M1785
footprint RP710
part A pins: 1, 2
part B pins: O0 O, O1 O@1, P0 P@1, P1 P, S0 S, S1 S@1

## RP?1*3
designator K?, comment Power PCB Relay RP II/1 SCHRACK   1 pole 16 A Source: http://www.schrack.com/.. 5834.pdf  (value not drawn)
MPN: RP310005; MPN: RP310006; MPN: RP310012.; MPN: RP310024; MPN: RP310048; MPN: RP310110; MF: TYCO ELECTRONICS; MF: FARNELL; OC_FARNELL: unknown; OC_NEWARK: 48M7769; OC_NEWARK: 08H3568; OC_FARNELL: 388294; OC_NEWARK: 87H7751; OC_FARNELL: 1838950; OC_NEWARK: 17M1783; OC_NEWARK: 08H3569; OC_NEWARK: unknown; OC_NEWARK: 97C5675
footprint RT-C/O16A5
part A pins: A1 1, A2 2
part B pins: 11A PA, 11B PB, 12A OA, 12B OB, 14A SA, 14B SB

## RP?1*7
designator K?, comment Power PCB Relay RP II/1 SCHRACK   1 pole 16 A Source: http://www.schrack.com/.. 5834.pdf  (value not drawn)
MPN: RP710005; MPN: RP710006; MPN: RP710012; MPN: RP710024; MPN: RP710048; MF: TYCO ELECTRONICS; MF: FARNELL; OC_FARNELL: unknown; OC_NEWARK: 52F964; OC_NEWARK: 08H3633; OC_FARNELL: 388312; OC_NEWARK: 50H2650; OC_FARNELL: 388324; OC_NEWARK: 17M1785; OC_NEWARK: 48M7825; OC_NEWARK: unknown
footprint RT-C/O16A5
part A pins: A1 1, A2 2
part B pins: 11A PA, 11B PB, 12A OA, 12B OB, 14A SA, 14B SB

## RP?3*3
designator K?, comment Power PCB Relay RP II/1 SCHRACK   1 pole 16 A Source: http://www.schrack.com/.. 5834.pdf  (value not drawn)
MPN: RP330048; OC_FARNELL: 388178; OC_NEWARK: 48M7779
footprint RT-N/O16A5
part A pins: A1 1, A2 2
part B pins: 11A PA, 11B PB, 14A SA, 14B SB

## RP?3*7
designator K?, comment Power PCB Relay RP II/1 SCHRACK   1 pole 16 A Source: http://www.schrack.com/.. 5834.pdf  (value not drawn)
OC_FARNELL: unknown; OC_NEWARK: unknown
footprint RT-N/O16A5
part A pins: A1 1, A2 2
part B pins: 11A PA, 11B PB, 14A SA, 14B SB

## RP?10*4
designator K?, comment Power PCB Relay RP II/1 SCHRACK   1 pole 8 / 12 A Source: http://www.schrack.com/.. 5834.pdf  (value not drawn)
OC_FARNELL: unknown; OC_NEWARK: unknown
footprint RT-C/O12A5
part A pins: A1 1, A2 2
part B pins: 11 P, 12 O, 14 S

## RP?10*8
designator K?, comment Power PCB Relay RP II/1 SCHRACK   1 pole 8 / 12 A Source: http://www.schrack.com/.. 5834.pdf  (value not drawn)
MPN: RP810012; MPN: 9-1393231-2; MPN: RP810048; MF: TYCO ELECTRONICS; OC_FARNELL: unknown; OC_NEWARK: unknown; OC_NEWARK: 48M7834; OC_NEWARK: 16H8837; OC_NEWARK: 08H3642
footprint RT-C/O12A5
part A pins: A1 1, A2 2
part B pins: 11 P, 12 O, 14 S

## RP?11*4
designator K?, comment Power PCB Relay RP II/1 SCHRACK   1 pole 8 / 12 A Source: http://www.schrack.com/.. 5834.pdf  (value not drawn)
MPN: RP411012; MPN: RP411024; MPN: RP411110; OC_FARNELL: unknown; OC_NEWARK: unknown; OC_NEWARK: 48M7784; OC_NEWARK: 48M7785; OC_NEWARK: 48M7786
footprint RT-C/O12A5
part A pins: A1 1, A2 2
part B pins: 11 P, 12 O, 14 S

## RP?11*8
designator K?, comment Power PCB Relay RP II/1 SCHRACK   1 pole 8 / 12 A Source: http://www.schrack.com/.. 5834.pdf  (value not drawn)
MPN: RP811024; OC_FARNELL: unknown; OC_NEWARK: unknown; OC_NEWARK: 48M7836
footprint RT-C/O12A5
part A pins: A1 1, A2 2
part B pins: 11 P, 12 O, 14 S

## RP?12*4
designator K?, comment Power PCB Relay RP II/1 SCHRACK   1 pole 8 / 12 A Source: http://www.schrack.com/.. 5834.pdf  (value not drawn)
MPN: 1393231-8; MPN: RP412012; MPN: RP412024; MPN: RP412110; MF: TYCO ELECTRONICS; OC_FARNELL: unknown; OC_NEWARK: 11H3247; OC_NEWARK: unknown; OC_NEWARK: 08H3590; OC_NEWARK: 48M7788; OC_NEWARK: 48M7789
footprint RT-C/O12A3.5
part A pins: A1 1, A2 2
part B pins: 11 P, 12 O, 14 S

## RP?12*8
designator K?, comment Power PCB Relay RP II/1 SCHRACK   1 pole 8 / 12 A Source: http://www.schrack.com/.. 5834.pdf  (value not drawn)
MPN: RP812024; MF: TYCO ELECTRONICS; OC_FARNELL: unknown; OC_NEWARK: unknown; OC_NEWARK: 08H3648
footprint RT-C/O12A3.5
part A pins: A1 1, A2 2
part B pins: 11 P, 12 O, 14 S

## RP?18*4
designator K?, comment Power PCB Relay RP II/1 SCHRACK   1 pole 8 / 12 A Source: http://www.schrack.com/.. 5834.pdf  (value not drawn)
MPN: RP418006; MPN: RP418012.; MPN: RP418024; MPN: RP418048; MPN: RP418110; MF: TYCO ELECTRONICS; OC_FARNELL: unknown; OC_NEWARK: unknown; OC_NEWARK: 48M7790; OC_FARNELL: 388191; OC_NEWARK: 14J7708; OC_FARNELL: 388221; OC_NEWARK: 17M1784; OC_NEWARK: 48M7792; OC_NEWARK: 48M7793
footprint RT-C/O12A3.5
part A pins: A1 1, A2 2
part B pins: 11 P, 12 O, 14 S

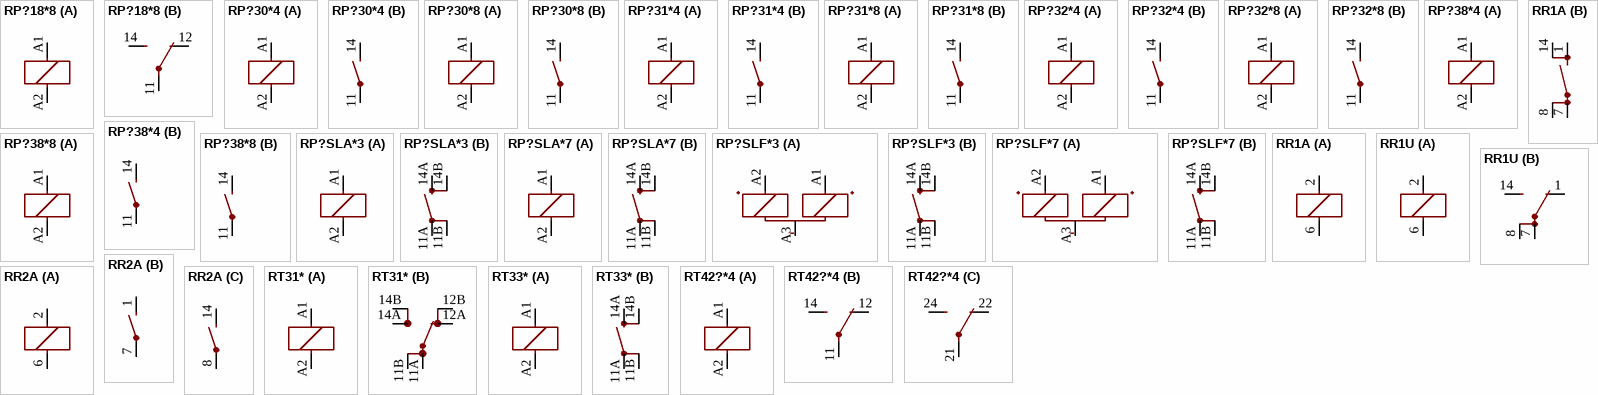
[diagram p19: symbols RP?18*8 to RT42?*4]

## RP?18*8
designator K?, comment Power PCB Relay RP II/1 SCHRACK   1 pole 8 / 12 A Source: http://www.schrack.com/.. 5834.pdf  (value not drawn)
MPN: RP818005; MPN: RP818006; MPN: RP818012; MPN: RP818024; MF: TYCO ELECTRONICS; OC_FARNELL: unknown; OC_NEWARK: 48M7838; OC_NEWARK: 08H3653; OC_FARNELL: 388270; OC_NEWARK: 52F974; OC_FARNELL: 388282; OC_NEWARK: 20C8802; OC_NEWARK: unknown
footprint RT-C/O12A3.5
part A pins: A1 1, A2 2
part B pins: 11 P, 12 O, 14 S

## RP?30*4
designator K?, comment Power PCB Relay RP II/1 SCHRACK   1 pole 8 / 12 A Source: http://www.schrack.com/.. 5834.pdf  (value not drawn)
OC_FARNELL: unknown; OC_NEWARK: unknown
footprint RT-N/O12A5
part A pins: A1 1, A2 2
part B pins: 11 P, 14 S

## RP?30*8
designator K?, comment Power PCB Relay RP II/1 SCHRACK   1 pole 8 / 12 A Source: http://www.schrack.com/.. 5834.pdf  (value not drawn)
OC_FARNELL: unknown; OC_NEWARK: unknown
footprint RT-N/O12A5
part A pins: A1 1, A2 2
part B pins: 11 P, 14 S

## RP?31*4
designator K?, comment Power PCB Relay RP II/1 SCHRACK   1 pole 8 / 12 A Source: http://www.schrack.com/.. 5834.pdf  (value not drawn)
MPN: 4-1393231-5; MF: TYCO ELECTRONICS; OC_FARNELL: unknown; OC_NEWARK: unknown; OC_NEWARK: 13H3096
footprint RT-N/O12A5
part A pins: A1 1, A2 2
part B pins: 11 P, 14 S

## RP?31*8
designator K?, comment Power PCB Relay RP II/1 SCHRACK   1 pole 8 / 12 A Source: http://www.schrack.com/.. 5834.pdf  (value not drawn)
OC_FARNELL: unknown; OC_NEWARK: unknown
footprint RT-N/O12A5
part A pins: A1 1, A2 2
part B pins: 11 P, 14 S

## RP?32*4
designator K?, comment Power PCB Relay RP II/1 SCHRACK   1 pole 8 / 12 A Source: http://www.schrack.com/.. 5834.pdf  (value not drawn)
MPN: RP432024; MF: TYCO ELECTRONICS; OC_FARNELL: unknown; OC_NEWARK: unknown; OC_NEWARK: 08H3615
footprint RT-N/O12A3.5
part A pins: A1 1, A2 2
part B pins: 11 P, 14 S

## RP?32*8
designator K?, comment Power PCB Relay RP II/1 SCHRACK   1 pole 8 / 12 A Source: http://www.schrack.com/.. 5834.pdf  (value not drawn)
MPN: 2-1393232-4; MF: TYCO ELECTRONICS; OC_FARNELL: unknown; OC_NEWARK: unknown; OC_NEWARK: 12H2332
footprint RT-N/O12A3.5
part A pins: A1 1, A2 2
part B pins: 11 P, 14 S

## RP?38*4
designator K?, comment Power PCB Relay RP II/1 SCHRACK   1 pole 8 / 12 A Source: http://www.schrack.com/.. 5834.pdf  (value not drawn)
MPN: 9-1393232-3; MPN: RP438024; MF: TYCO ELECTRONICS; OC_FARNELL: unknown; OC_NEWARK: unknown; OC_NEWARK: 16H8839; OC_NEWARK: 08H3617
footprint RT-N/O12A3.5
part A pins: A1 1, A2 2
part B pins: 11 P, 14 S

## RP?38*8
designator K?, comment Power PCB Relay RP II/1 SCHRACK   1 pole 8 / 12 A Source: http://www.schrack.com/.. 5834.pdf  (value not drawn)
MPN: RP838006; MPN: RP838012; MPN: RP838024; MF: TYCO ELECTRONICS; OC_FARNELL: unknown; OC_NEWARK: unknown; OC_NEWARK: 52F982; OC_NEWARK: 48M7858; OC_NEWARK: 52F984
footprint RT-N/O12A3.5
part A pins: A1 1, A2 2
part B pins: 11 P, 14 S

## RP?SLA*3
designator K?, comment Special Load PCB Relay SCHRACK   1 pole 16 A, for high inrush currents, monostable Source: http://www.schrack.com/.. 5837.pdf  (value not drawn)
MPN: RP3SLA05; MPN: RP3SLA12; MPN: RP3SLA24; MF: TYCO ELECTRONICS; OC_FARNELL: unknown; OC_NEWARK: 08H3553; OC_NEWARK: 08H3554; OC_NEWARK: 08H3555
footprint RP-SLA
part A pins: A1 1, A2 2
part B pins: 11A PA, 11B PB, 14A SA, 14B SB